# Altium footprint library bethu.PcbLib: 628 footprints (part 2 of 40)
Each footprint in its own frame and in the unit in brackets; x right, y up, seen from the top. Pads: shape width x height; smd on the part's side, far side on the other; paste and mask are expansions set on the pad; w line width, h text height; cw(c..) or ccw(c..) is an arc to the next point about the centre after c.
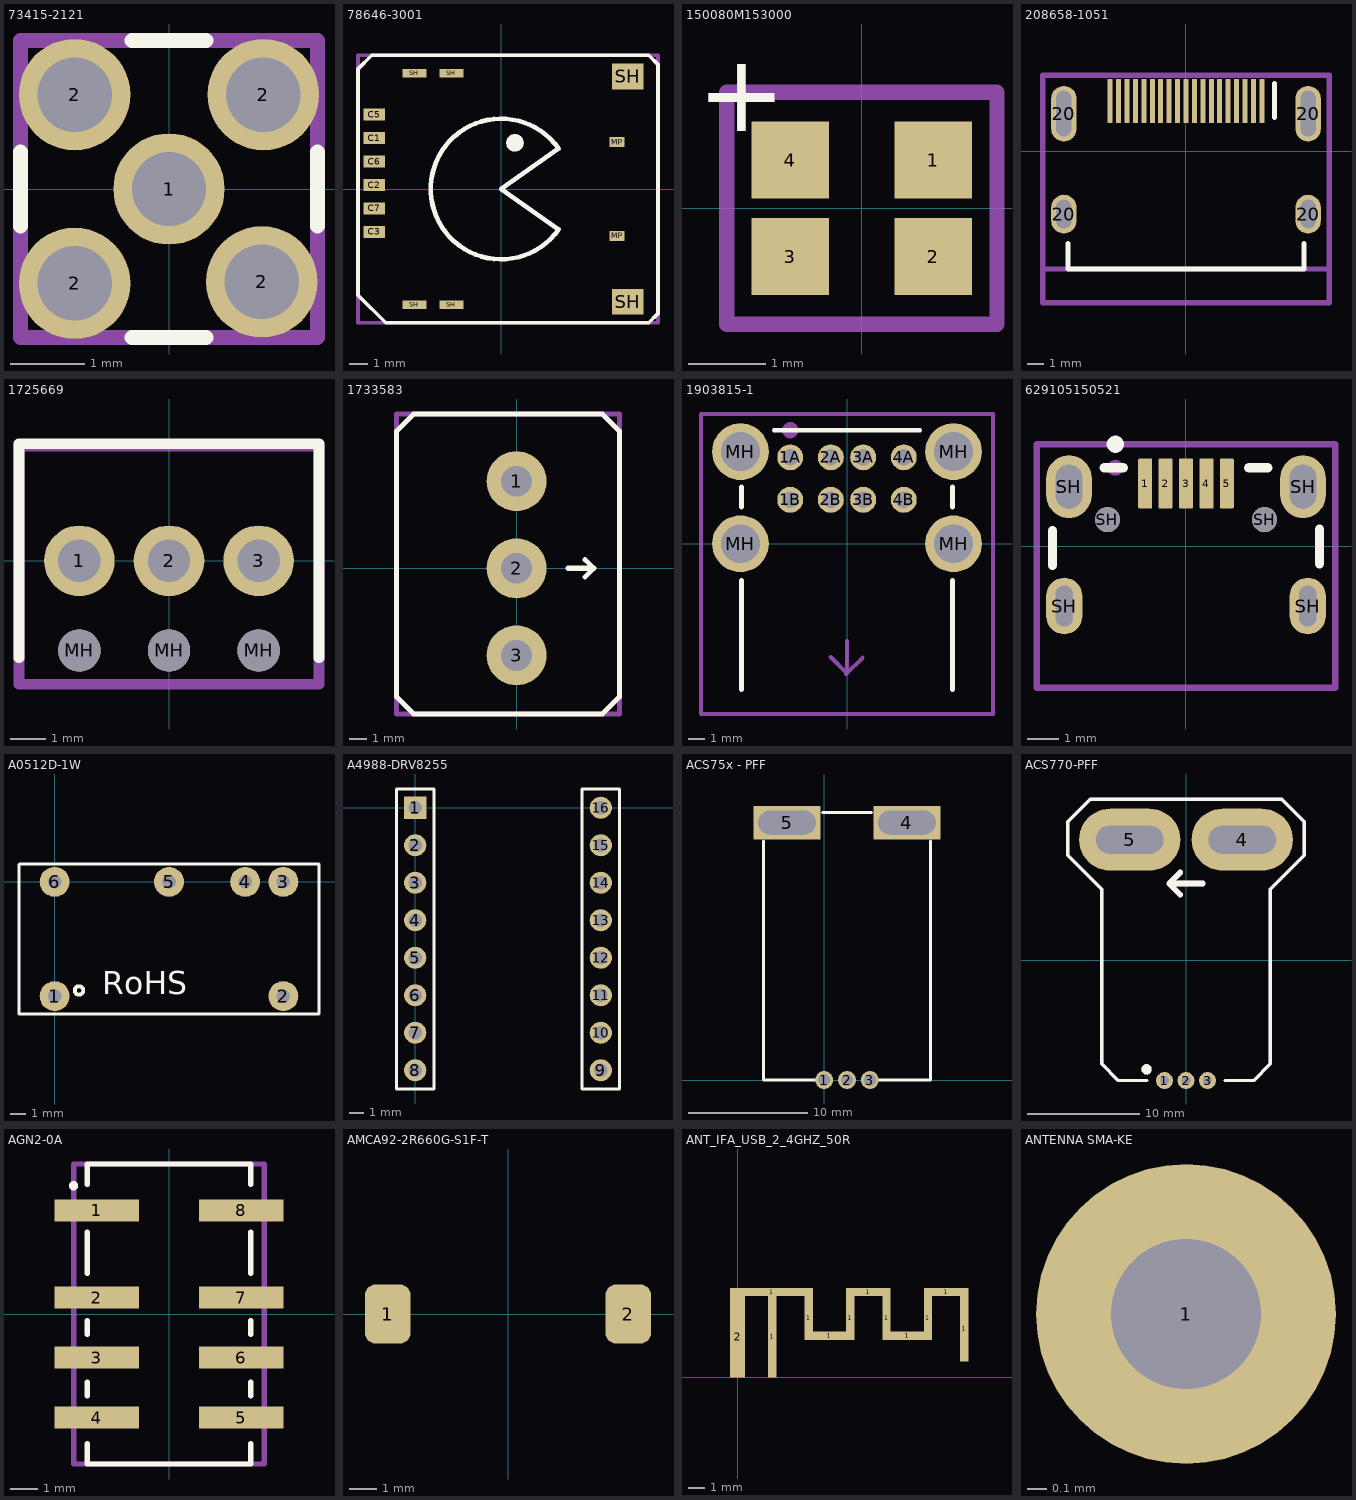
[diagram p1: the footprints below, top view; thin cyan lines are the x and y axes]

## 73415-2121 [mm]
pads (5):
  round 1.5 hole 1 mask+0.07: 1(0,0) 2(-1.27,-1.27) 2(-1.27,1.27) 2(1.25,-1.25) 2(1.27,1.27)
Top Overlay:
  lines w0.2: -2,-0.5 -2,0.5 ; -0.5,-2 0.5,-2 ; -0.5,2 0.5,2 ; 2,-0.5 2,0.5
Mechanical 13:
  lines w0.2: -2,-2 2,-2 2,2 -2,2 -2,-2
  text "'.Designator'" at -5.665,-0.417 h1
3D body "734152121.stp": height 4.73, standoff -2.76, extent -1.725,-1.725 1.725,1.725

## 78646-3001 [mm]
pads (14):
  rect 1.15x0.65 smd: C1(-6.865,2.755) C2(-6.865,0.215) C3(-6.865,-2.325) C5(-6.865,4.025) C6(-6.865,1.485) C7(-6.865,-1.055)
  rect 0.8x0.54 smd: MP(6.285,-2.54) MP(6.285,2.54)
  rect 1.3x0.45 smd: SH(-4.695,-6.27) SH(-4.695,6.27) SH(-2.695,-6.27) SH(-2.695,6.27)
  rect 1.7x1.4 smd: SH(6.865,-6.11) SH(6.865,6.1)
Top Overlay:
  circle w0.254: c0.75,2.5 r0.198
  circle w0.254: c0.75,2.5 r0.354
  lines w0.2: -7.75,-5.75 -6.25,-7.25 8,-7.25 8.5,-6.75 8.5,6.75 8,7.25 -7,7.25 -7.75,6.5 -7.75,5 -7.75,-5.75
  lines w0.25: 3.119,-2.184 0,0 3.119,2.184
  lines w0.254: 0.855,2.522 ccw(c0.75,2.5) 0.857,2.5 ; 3.119,-2.184 cw(c0,0) 3.119,2.184
Mechanical 13:
  lines w0.2: -7.75,-7.25 8.5,-7.25 8.5,7.25 -7.75,7.25 -7.75,-2.25 -7.75,-7.25
  text "'.Designator'" at -5.815,-0.9 h1
3D body "786463001.stp": height 1.46, standoff 0.01, extent -7.304,-6.556 8.146,6.494

## 150080M153000 [mm]
pads (4):
  rect 1x1 smd mask+0.15: 1(0.925,0.625) 2(0.925,-0.625) 3(-0.925,-0.625) 4(-0.925,0.625)
Top Overlay:
  text "+" at -2.133,1 h1
Mechanical 13:
  lines w0.2: -1.75,-1.5 -1.75,1.5 1.75,1.5 1.75,-1.5 -1.75,-1.5
  text "+" at -2.583,1.5 h1
  text "'.Designator'" at -5.665,-0.417 h1
3D body "150080M153000.stp": height 0.51, standoff 0.01, extent -1,-0.65 1,0.65

## 208658-1051 [mm]
pads (23):
  rect 0.3x2.6 smd mask+0.07: 1(4.5,2.98) 2(4,2.98) 3(3.5,2.98) 4(3,2.98) 5(2.5,2.98) 6(2,2.98) 7(1.5,2.98) 8(1,2.98) 9(0.5,2.98) 10(0,2.98) 11(-0.5,2.98) 12(-1,2.98) 13(-1.5,2.98) 14(-2,2.98) 15(-2.5,2.98) 16(-3,2.98) 17(-3.5,2.98) 18(-4,2.98) 19(-4.5,2.98)
  oval 1.5x2.3 hole 0.9 slot 1.7 at 90 deg mask+0.07: 20(-7.25,-3.74) 20(7.25,-3.74)
  oval 1.5x3.3 hole 0.9 slot 2.7 at 90 deg mask+0.07: 20(-7.25,2.22) 20(7.25,2.22)
Top Overlay:
  lines w0.3: -7,-5.5 -7,-7 7,-7 7,-5.5 ; 5.25,2 5.25,4
Mechanical 13:
  lines w0.3: -8.5,-7 8.5,-7 ; -8.5,-9 8.5,-9 8.5,4.5 -8.5,4.5 -8.5,-4.5 -8.5,-9
  text "'.Designator'" at -5.84,-0.925 h1
3D body "208658-1051.stp": height 6.19, standoff -2.61, extent -7.497,-8.548 7.506,3.887

## 1725669 [mm]
pads (6):
  round 2 hole 1.2: 1(-2.54,0) 2(0,0) 3(2.54,0)
  round 1.2 hole 1.2 unplated: MH(-2.54,-2.54) MH(0,-2.54) MH(2.54,-2.54)
Top Overlay:
  lines w0.3: -4.25,-2.75 -4.25,3.32 4.25,3.32 4.25,-2.75
Mechanical 13:
  lines w0.3: -4.25,-3.5 4.25,-3.5 4.25,3.25 -4.25,3.25 -4.25,-3.5
  text "'.Designator'" at -5.665,-0.417 h1
3D body "1725669.stp": height 8.51, standoff -3.49, extent -4.03,-3.1 4.05,3.1

## 1733583 [mm]
pads (3):
  round 3.5 hole 1.8: 1(0,5.08) 2(0,0) 3(0,-5.08)
Top Overlay:
  lines w0.3: 3,0 4.5,0 ; 4,-0.5 4.5,0 ; 4,0.5 4.5,0 ; -7,-7.5 -7,8 -6,9 5,9 6,8 6,-7.5 5,-8.5 -6,-8.5 -7,-7.5
Mechanical 13:
  lines w0.3: -7,-8.5 6,-8.5 6,9 -7,9 -7,-8.5
  text "'.Designator'" at -6.315,-1.4 h1
3D body "1733583.stp": height 15.31, standoff -3.49, extent -6.398,-7.6 7.002,8.381

## 1903815-1 [mm]
pads (12):
  round 1.6 hole 1: 1A(-3.5,5.33) 1B(-3.5,2.71) 2A(-1,5.33) 2B(-1,2.71) 3A(1,5.33) 3B(1,2.71) 4A(3.5,5.33) 4B(3.5,2.71)
  round 3.5 hole 2.4: MH(-6.57,0) MH(-6.57,5.68) MH(6.57,0) MH(6.57,5.68)
Top Overlay:
  lines w0.254: -4.5,7 4.5,7
  lines w0.3: -6.5,-9 -6.5,-2.25 ; -6.5,2.25 -6.5,3.5 ; 6.5,-9 6.5,-2.25 ; 6.5,2.25 6.5,3.5
Mechanical 13:
  circle w0.5: c-3.5,7 r0.25
  lines w0.254: -1,-7 0,-8 ; -0.051,-8.034 0.949,-7.034 ; 0,-6 0,-8 ; 0,-8 0,-8 ; -9,-10.5 -9,-3.5 -9,8 9,8 9,-10.5 -9,-10.5
  text "'.Designator'" at -5.665,-0.417 h1
3D body "1903815-1.stp": height 16.21, standoff -3.71, extent -7.799,-10.3 7.799,6.66

## 629105150521 [mm]
height 2.35
pads (11):
  rrect25% 0.45x1.6 smd mask+0.12: 1(-1.3,2) 2(-0.65,2) 3(0,2) 4(0.65,2) 5(1.3,2)
  oval 1.15x1.8 hole 0.55 slot 1.3 at 90 deg: SH(-3.875,-1.9) SH(3.875,-1.9)
  oval 1.45x2 hole 0.85 slot 1.4 at 90 deg mask+0.15: SH(-3.725,1.9) SH(3.725,1.9)
  round 0.8 hole 0.8 unplated mask+0.3: SH(-2.5,0.85) SH(2.5,0.85)
Top Overlay:
  circle w0.3: c-2.25,3.25 r0.125
  lines w0.3: -4.25,-0.6 -4.25,0.5 ; -2.6,2.5 -2,2.5 ; 2,2.5 2.6,2.5 ; 4.25,-0.55 4.25,0.55
Mechanical 13:
  circle w0.3: c-2.25,2.5 r0.1
  lines w0.2: -4.75,-4.5 -4.75,3.25 4.75,3.25 4.75,-4.5 -4.75,-4.5
  text ".Designator" at -4.998,-0.333 h1
3D body "629105150521.stp": height 2.78, standoff -1.75, extent -4,-4.3 4,2.303

## A0512D-1W [mm]
pads (6):
  round 2 hole 0.9: 1(0,-7.62) 2(15.24,-7.62) 3(15.24,0) 4(12.7,0) 5(7.62,0) 6(0,0)
Top Overlay:
  circle w0.254: c1.621,-7.239 r0.284
  lines w0.2: -2.38,-8.81 17.62,-8.81 17.62,1.19 -2.333,1.19 -2.38,1.143 -2.38,-8.81
  text "RoHS" at 3.175,-7.493 h1.52
3D body "A0512D-1W.STEP": height 7.2, standoff -4.1, extent -2.38,-8.81 17.62,1.19

## A4988-DRV8255 [mm] "Module Stepping Motor"
pads (16):
  rect 1.5x1.5 hole 0.9: 1(0,0)
  round 1.5 hole 0.9: 2(0,-2.54) 3(0,-5.08) 4(0,-7.62) 5(0,-10.16) 6(0,-12.7) 7(0,-15.24) 8(0,-17.78) 9(12.573,-17.78) 10(12.573,-15.24) 11(12.573,-12.7) 12(12.573,-10.16) 13(12.573,-7.62) 14(12.573,-5.08) 15(12.573,-2.54) 16(12.573,0)
Top Overlay:
  lines w0.2: -1.27,-19.05 -1.27,1.27 1.27,1.27 1.27,-19.05 -1.27,-19.05 ; 11.303,-19.05 13.843,-19.05 13.843,1.27 11.303,1.27 11.303,-19.05
3D body "User Library-RM254_4pin.STEP": height 6.02, standoff -3.1, extent -1.27,-8.89 1.27,1.27
3D body "User Library-RM254_4pin.STEP": height 6.02, standoff -3.1, extent -1.27,-19.05 1.27,-8.89
3D body "User Library-RM254_4pin.STEP": height 6.02, standoff -3.1, extent 11.303,-19.05 13.843,-8.89
3D body "User Library-RM254_4pin.STEP": height 6.02, standoff -3.1, extent 11.303,-8.89 13.843,1.27
3D body "stepstick.X_T": height 16, standoff -0.04, extent -1.397,-18.923 13.843,1.397

## ACS75x - PFF [mm]
pads (5):
  round 1.5 hole 1: 1(0,0) 2(1.91,0) 3(3.82,0)
  rect 5.6x2.8 hole 2 slot 4.8 at 0 deg: 4(6.91,21.5) 5(-3.09,21.5)
Top Overlay:
  lines w0.254: -5.08,19.939 -5.08,0 -0.762,0 ; -0.127,22.352 3.937,22.352 ; 4.572,0 8.89,0 8.89,19.939
3D body "SW3dPS-ACS754SCB-200-PFF.STEP": height 7, standoff -3.51, extent -5.095,-0.508 8.905,22.314

## ACS770-PFF [mm]
pads (5):
  round 1.5 hole 0.8: 1(-1.91,-10.7) 2(0,-10.7) 3(1.91,-10.7)
  oval 9x5.5 hole 2.5 slot 6 at 0 deg: 4(5,10.7) 5(-5,10.7)
Top Overlay:
  circle w0.5: c-3.5,-9.7 r0.203
  lines w0.3: -3.5,-10.7 -6,-10.7 -7.5,-9.2 -7.5,0.8 -7.5,6.3 -10.5,9.3 -10.5,12.3 -8.5,14.3 0,14.3 8.5,14.3 10.5,12.3 10.5,9.3 8.5,7.3 7.5,6.3 7.5,-9.2 6,-10.7 3.5,-10.7
  lines w0.5: -0.5,5.8 -1.5,6.8 ; -0.5,7.8 -1.5,6.8 ; 1.5,6.8 -1.5,6.8
Mechanical 13:
  circle w0.5: c-3.5,-9.7 r0.203
  lines w0.3: -3.5,-10.7 -6,-10.7 -7.5,-9.2 -7.5,0.8 -7.5,6.3 -10.5,9.3 -10.5,12.3 -8.5,14.3 0,14.3 8.5,14.3 10.5,12.3 10.5,9.3 8.5,7.3 7.5,6.3 7.5,-9.2 6,-10.7 3.5,-10.7
  lines w0.5: -0.5,5.8 -1.5,6.8 ; -0.5,7.8 -1.5,6.8 ; 1.5,6.8 -1.5,6.8
  text "'.Designator'" at -6.315,-1.4 h1
3D body "ACS770-PFF.STEP": height 7.01, standoff -3.52, extent -7.002,-11.214 6.998,11.603

## AGN2-0A [mm]
pads (8):
  rect 3.1x0.8 smd: 1(-2.65,3.8) 2(-2.65,0.6) 3(-2.65,-1.6) 4(-2.65,-3.8) 5(2.65,-3.8) 6(2.65,-1.6) 7(2.65,0.6) 8(2.65,3.8)
Top Overlay:
  circle w0.3: c-3.5,4.7 r0.021
  lines w0.2: -3,-4.75 -3,-5.5 3,-5.5 3,-4.75 ; -3,-3 -3,-2.5 ; -3,-0.75 -3,-0.25 ; -3,1.5 -3,3 ; -3,4.75 -3,5.5 3,5.5 3,4.75 ; 3,-3 3,-2.5 ; 3,-0.75 3,-0.25 ; 3,1.5 3,3
Mechanical 13:
  circle w0.3: c-2.2,3.8 r0.108
  lines w0.2: -3.5,-5.5 -3.5,5.5 3.5,5.5 3.5,-5.5 -3.5,-5.5
  text ".Designator" at -4.998,-0.333 h1
3D body "agn210a12.step": height 10.04, standoff 0.04, extent -3.7,-5.3 3.7,5.3

## AMCA92-2R660G-S1F-T [mm]
pads (2):
  rrect50% 1.7x2.2 smd: 1(-4.45,0) 2(4.45,0)
3D body "AMCA92-2R660G-S1F-T4--3DModel-STEP-400430.STEP": height 1, standoff 0, extent -4,-0.5 4,0.5

## ANT_IFA_USB_2_4GHZ_50R [mm]
pads (12):
  rect 5x0.5 smd paste-2539.97 mask+0.102: 1(2.05,5.15)
  rect 0.5x4.9 smd paste-2539.97 mask+0.102: 1(2.1,2.45)
  rect 0.5x2.64 smd paste-2539.97 mask+0.102: 1(4.3,3.58) 1(6.8,3.58) 1(9,3.58) 1(11.5,3.58)
  rect 2x0.5 smd paste-2539.97 mask+0.102: 1(5.55,2.51) 1(10.25,2.51)
  rect 2.7x0.5 smd paste-2539.97 mask+0.102: 1(7.9,5.15) 1(12.6,5.15)
  rect 0.5x3.94 smd paste-2539.97 mask+0.102: 1(13.7,2.93)
  rect 0.9x4.9 smd paste-2539.97 mask+0.102: 2(0,2.45)

## ANTENNA SMA-KE [mil]
pads (1):
  round 60 hole 30: 1(150,-100)
3D body "SMA surface mount jack.stp": height 338.58, standoff -50, extent 20,-230 270,20